# Altium footprint library PCBLIB.PcbLib: 103 footprints (part 1 of 7)
Each footprint in its own frame and in the unit in brackets; x right, y up, seen from the top. Pads: shape width x height; smd on the part's side, far side on the other; paste and mask are expansions set on the pad; w line width, h text height; cw(c..) or ccw(c..) is an arc to the next point about the centre after c.
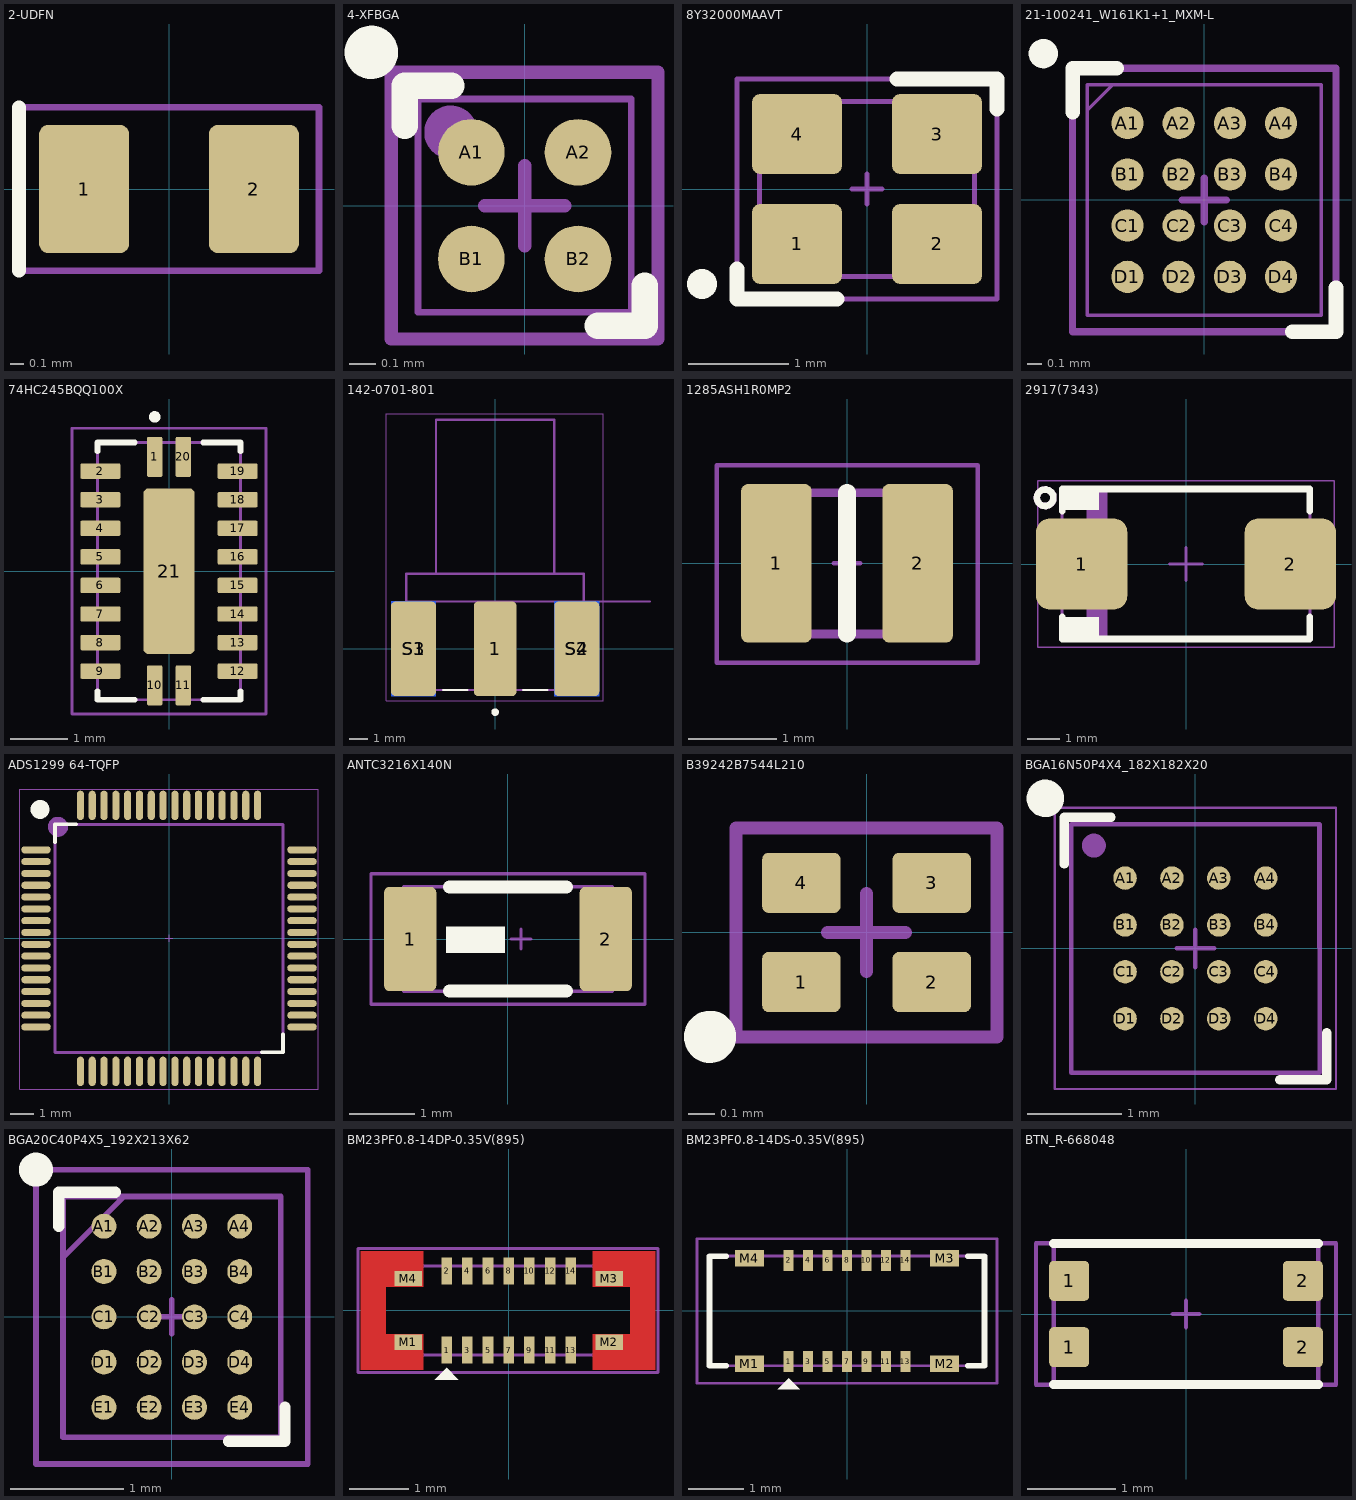
[diagram p0: the footprints below, top view; thin cyan lines are the x and y axes]

## 2-UDFN [mil]
pads (2):
  rrect20% 26x37 smd paste+0 mask+1.97: 1(-24.5,0) 2(24.5,0)
Top Overlay:
  lines w3.94: -43.31,-23.62 -43.31,23.62
Top Component Outline:
  lines w1.97: -43.31,-23.62 43.31,-23.62 43.31,23.62 -43.31,23.62 -43.31,-23.62
3D body "CR_UCLAMP0571PTNT_SEM.step": height 22.24, standoff 0, extent -32.52,-20.51 32.52,20.51

## 4-XFBGA [mm] "Power Switch/Driver 1:1 P-Channel 500mA 4-DSBGA (0.8x0.8)"
pads (4):
  round 0.25 smd mask+0.05: A1(-0.2,0.2) A2(0.2,0.2) B1(-0.2,-0.2) B2(0.2,-0.2)
Top Overlay:
  circle w0.1: c-0.575,0.575 r0.05
  lines w0.1: -0.45,0.3 -0.45,0.45 -0.275,0.45 ; 0.275,-0.45 0.45,-0.45 0.45,-0.3
Top Component Center:
  lines w0.05: -0.15,0 0.15,0 ; 0,-0.15 0,0.15
Top Component Outline:
  circle w0.1: c-0.277,0.275 r0.05
  lines w0.05: -0.5,-0.5 -0.5,0.5 0.5,0.5 0.5,-0.5 -0.5,-0.5
Top Assembly:
  lines w0.025: -0.4,-0.4 0.4,-0.4 0.4,0.4 -0.4,0.4 -0.4,-0.4
  text ".Designator" at -0.674,-0.068 h0.3
3D body "YFP4_TEX.step": height 0.5, standoff 0, extent -0.4,-0.4 0.4,0.4

## 8Y32000MAAVT [mm]
pads (4):
  rrect20% 0.9x0.8 smd mask+0.05: 1(-0.7,-0.55) 2(0.7,-0.55) 3(0.7,0.55) 4(-0.7,0.55)
Top Overlay:
  lines w0.15: -1.3,-0.8 -1.3,-1.1 -0.3,-1.1 ; 0.3,1.1 1.3,1.1 1.3,0.8
  lines w0.2: -1.7,-0.95 cw(c-1.65,-0.95) -1.6,-0.95 ; -1.7,-0.95 ccw(c-1.65,-0.95) -1.6,-0.95 ; -1.7,-0.95 -1.6,-0.95
Top Component Center:
  lines w0.05: -0.15,0 0.15,0 ; 0,-0.15 0,0.15
Top Component Outline:
  lines w0.05: -1.3,-1.1 1.3,-1.1 1.3,1.1 -1.3,1.1 -1.3,-1.1
Top Assembly:
  lines w0.05: -1.075,-0.875 -1.075,0.875 1.075,0.875 1.075,-0.875 -1.075,-0.875
  text ".Designator" at -0.897,-0.09 h0.4
3D body "User Library-TG-5006CJ.STEP": height 0.73, standoff 0, extent -1,-0.8 1,0.8

## 21-100241_W161K1+1_MXM-L [mm]
pads (16):
  round 0.22 smd paste+0 mask+0.05: A1(-0.525,0.525) A2(-0.175,0.525) A3(0.175,0.525) A4(0.525,0.525) B1(-0.525,0.175) B2(-0.175,0.175) B3(0.175,0.175) B4(0.525,0.175) C1(-0.525,-0.175) C2(-0.175,-0.175) C3(0.175,-0.175) C4(0.525,-0.175) D1(-0.525,-0.525) D2(-0.175,-0.525) D3(0.175,-0.525) D4(0.525,-0.525)
Top Overlay:
  circle w0.1: c-1.1,1 r0.05
  lines w0.1: -0.9,0.6 -0.9,0.9 -0.6,0.9 ; 0.6,-0.9 0.9,-0.9 0.9,-0.6
Top Component Center:
  lines w0.05: -0.15,0 0.15,0 ; 0,-0.15 0,0.15
Top Component Outline:
  lines w0.05: -0.9,-0.9 -0.9,0.9 0.9,0.9 0.9,-0.9 -0.9,-0.9
Top Assembly:
  lines w0.025: -0.8,0.612 -0.625,0.787 ; -0.8,-0.787 -0.8,0.787 0.8,0.787 0.8,-0.787 -0.8,-0.787
  text ".Designator" at -0.897,-0.09 h0.4
3D body "21-100241_W161K1+1_MXM.step": height 0.69, standoff 0, extent -0.8,-0.787 0.8,0.787

## 74HC245BQQ100X [mm]
pads (21):
  rrect20% 0.27x0.7 smd mask+0.05: 1(-0.25,2) 10(-0.25,-2) 11(0.25,-2) 20(0.25,2)
  rrect20% 0.7x0.27 smd mask+0.05: 2(-1.2,1.75) 3(-1.2,1.25) 4(-1.2,0.75) 5(-1.2,0.25) 6(-1.2,-0.25) 7(-1.2,-0.75) 8(-1.2,-1.25) 9(-1.2,-1.75) 12(1.2,-1.75) 13(1.2,-1.25) 14(1.2,-0.75) 15(1.2,-0.25) 16(1.2,0.25) 17(1.2,0.75) 18(1.2,1.25) 19(1.2,1.75)
  rrect20% 0.9x2.9 smd mask+0.05: 21(0,0)
Top Overlay:
  lines w0.1: -1.25,-2.1 -1.25,-2.25 -0.6,-2.25 ; -1.25,2.1 -1.25,2.25 -0.6,2.25 ; -0.297,2.683 ccw(c-0.25,2.7) -0.3,2.7 ccw(c-0.25,2.7) -0.2,2.7 ; 0.6,-2.25 1.25,-2.25 1.25,-2.1 ; 0.6,2.25 1.25,2.25 1.25,2.1
Top Component Center:
  lines w0.05: -0.15,0 0.15,0 ; 0,-0.15 0,0.15
Top Component Outline:
  lines w0.05: -1.7,-2.5 -1.7,2.5 1.7,2.5 1.7,-2.5 -1.7,-2.5
Top Assembly:
  lines w0.05: -1.25,-2.25 1.25,-2.25 1.25,2.25 -1.25,2.25 -1.25,-2.25
  text ".Designator" at -0.897,-0.09 h0.4
3D body "NVT2008BQ,115.stp": height 1.1, standoff 0, extent -1.25,-2.25 1.25,2.25

## 142-0701-801 [mil] "CONN SMA JACK STR 50OHM EDGE MNT"
height 327.95
pads (5):
  rrect20% 90x200 smd: 1(0,0)
  rrect20% 95x200 smd: S1(-172.5,0) S2(172.5,0)
  rect 95x200 smd far side: S3(-172.5,0) S4(172.5,0)
Top Overlay:
  circle w7.87: c0,-133.86 r3.94
  lines w5: -110.24,-87 -59.06,-87 ; 59.06,-87 110.24,-87
Top Component Outline:
  lines w1.97: -229.84,-110.24 -229.84,496.06 228.35,496.06 228.35,-110.24 -229.84,-110.24
Bottom Courtyard:
  lines w5: 188.98,100 326.77,100 ; -187.5,100 187.5,100 ; -187.5,100 -187.5,-87 187.5,-87 187.5,100 ; -187.5,100 -187.5,158.5 -125,158.5 ; -125,158.5 125,158.5 ; -125,158.5 -125,484.25 125,484.25 125,158.5 ; 125,158.5 187.5,158.5 187.5,100
  text "PCB Edge" at 248.03,114.17 h50
3D body "142-0701-801.stp": height 171.75, standoff -140.25, extent -187.5,-68.89 187.5,493.11

## 1285ASH1R0MP2 [mm]
pads (2):
  rrect20% 0.8x1.8 smd mask+0.05: 1(-0.8,0) 2(0.8,0)
Top Overlay:
  lines w0.2: 0,-0.8 0,0.8
Top Component Center:
  lines w0.05: -0.15,0 0.15,0 ; 0,-0.15 0,0.15
Top Component Outline:
  lines w0.05: -1.475,-1.125 1.484,-1.125 1.484,1.11 -1.475,1.11 -1.475,-1.125
Top Assembly:
  lines w0.1: -1,-0.8 -1,0.8 1,0.8 1,-0.8 -1,-0.8
  text ".Designator" at -0.897,-0.09 h0.4
3D body "DFE201610P-R47M=P2.STEP": height 1, standoff 0, extent -1,-0.8 1,0.8

## 2917(7343) [mm] "Chip Capacitor, 2-Leads, Body 7,30x4,30mm, IPC Medium Density"
height 1.9
pads (2):
  rrect30% 2.8x2.8 smd mask+0.05: 1(-3.2,0) 2(3.2,0)
Top Overlay:
  circle w0.2: c-4.318,2.032 r0.254
  rectangle: -3.8,1.651 -2.667,2.3
  rectangle: -3.8,-2.286 -2.667,-1.625
  lines w0.2: -3.8,-1.625 -3.8,-2.3 3.8,-2.3 3.8,-1.625 ; -3.8,1.625 -3.8,2.3 3.8,2.3 3.8,1.625
Top Designator:
  text ".Designator" at -1.589,-0.158 h0.7
Bottom Courtyard:
  circle w0.2: c-4.318,2.032 r0.254
  rectangle: -3.048,-2.286 -2.413,2.286
  lines w0.1: -3.8,-2.3 -3.8,2.3 3.8,2.3 3.8,-2.3 -3.8,-2.3
Bottom 3D Body:
  lines w0.05: -4.55,-2.55 -4.55,2.55 4.55,2.55 4.55,-2.55 -4.55,-2.55
  lines w0.1: -0.5,0 0.5,0 ; 0,-0.5 0,0.5
3D body "User Library-CAP_TANT_7343-31.step": height 3.1, standoff 0, extent -3.8,-2.3 3.8,2.3

## ADS1299 64-TQFP [mm] "12x12 mm, 0.5mm pitch"
height 1
pads (64):
  oval 1.25x0.3 smd mask+0.05: 1(-5.63,3.75) 2(-5.63,3.25) 3(-5.63,2.75) 4(-5.63,2.25) 5(-5.63,1.75) 6(-5.63,1.25) 7(-5.63,0.75) 8(-5.63,0.25) 9(-5.63,-0.25) 10(-5.63,-0.75) 11(-5.63,-1.25) 12(-5.63,-1.75) 13(-5.63,-2.25) 14(-5.63,-2.75) 15(-5.63,-3.25) 16(-5.63,-3.75) 33(5.63,-3.75) 34(5.63,-3.25) 35(5.63,-2.75) 36(5.63,-2.25) 37(5.63,-1.75) 38(5.63,-1.25) 39(5.63,-0.75) 40(5.63,-0.25) 41(5.63,0.25) 42(5.63,0.75) 43(5.63,1.25) 44(5.63,1.75) 45(5.63,2.25) 46(5.63,2.75) 47(5.63,3.25) 48(5.63,3.75)
  oval 0.3x1.25 smd mask+0.05: 17(-3.75,-5.63) 18(-3.25,-5.63) 19(-2.75,-5.63) 20(-2.25,-5.63) 21(-1.75,-5.63) 22(-1.25,-5.63) 23(-0.75,-5.63) 24(-0.25,-5.63) 25(0.25,-5.63) 26(0.75,-5.63) 27(1.25,-5.63) 28(1.75,-5.63) 29(2.25,-5.63) 30(2.75,-5.63) 31(3.25,-5.63) 32(3.75,-5.63) 49(3.75,5.63) 50(3.25,5.63) 51(2.75,5.63) 52(2.25,5.63) 53(1.75,5.63) 54(1.25,5.63) 55(0.75,5.63) 56(0.25,5.63) 57(-0.25,5.63) 58(-0.75,5.63) 59(-1.25,5.63) 60(-1.75,5.63) 61(-2.25,5.63) 62(-2.75,5.63) 63(-3.25,5.63) 64(-3.75,5.63)
Top Overlay:
  circle w0.4: c-5.461,5.461 r0.2
  lines w0.15: -4.826,4.064 -4.826,4.826 -3.937,4.826 ; 3.937,-4.826 4.826,-4.826 4.826,-4.064
Mechanical 1:
  lines w0.127: -4.826,-4.826 4.826,-4.826 4.826,4.826 -4.826,4.826 -4.826,-4.826
Top Component Outline:
  circle w0.5: c-4.7,4.725 r0.174
  lines w0.05: -6.325,-6.375 -6.325,6.325 6.325,6.325 6.325,-6.375 -6.325,-6.375
Top Designator:
  text ".Designator" at 0.897,0.065 h0.4
Bottom Designator:
  text ".Designator" at -2.385,-0.369 h1.52
Mechanical 10:
  lines w0.05: -0.15,0 0.15,0 ; 0,-0.15 0,0.15
  lines w0.1: -4.826,-4.826 -4.826,4.826 4.826,4.826 4.826,-4.826 -4.826,-4.826
  text ".Designator" at 1.126,0.088 h0.5
3D body "User Library-S-PQFP-G64.step": height 1, standoff 0, extent -5.791,-5.787 5.79,5.787

## ANTC3216X140N [mm]
pads (2):
  rrect20% 0.8x1.6 smd mask+0.05: 1(-1.5,0) 2(1.5,0)
Top Overlay:
  region: -0.95,0.187 -0.95,-0.213 -0.05,-0.213 -0.05,0.187
  lines w0.2: -0.9,-0.8 0.9,-0.8 ; -0.9,0.8 0.9,0.8
Top Component Outline:
  lines w0.05: -2.1,-1 2.1,-1 2.1,1 -2.1,1 -2.1,-1
Top Designator:
  text ".Designator" at -0.697,-0.09 h0.4
Mechanical 10:
  lines w0.05: 0.05,0 0.35,0 ; 0.2,-0.15 0.2,0.15 ; -1.6,-0.8 -1.6,0.8 1.6,0.8 1.6,-0.8 -1.6,-0.8
3D body "2450AT18A100E--3DModel-STEP-56544.STEP": height 1.4, standoff 0, extent -1.6,-0.8 1.6,0.8

## B39242B7544L210 [mm]
pads (4):
  rrect20% 0.3x0.23 smd mask+0.05: 1(-0.25,-0.19) 2(0.25,-0.19) 3(0.25,0.19) 4(-0.25,0.19)
Top Overlay:
  circle w0.1: c-0.6,-0.4 r0.05
Top Component Center:
  lines w0.05: -0.15,0 0.15,0 ; 0,-0.15 0,0.15
Top Component Outline:
  lines w0.05: -0.5,-0.4 0.5,-0.4 0.5,0.4 -0.5,0.4 -0.5,-0.4
Top Assembly:
  text ".Designator" at -0.897,-0.09 h0.4
3D body: height 0.35, standoff 0, extent -0.4,-0.3 0.4,0.3

## BGA16N50P4X4_182X182X20 [mm] "Amplifier IC 2-Channel (Stereo) Class D 16-DSBGA (2.24x2.16)"
pads (16):
  round 0.25 smd paste+0 mask+0.05: A1(-0.75,0.75) A2(-0.25,0.75) A3(0.25,0.75) A4(0.75,0.75) B1(-0.75,0.25) B2(-0.25,0.25) B3(0.25,0.25) B4(0.75,0.25) C1(-0.75,-0.25) C2(-0.25,-0.25) C3(0.25,-0.25) C4(0.75,-0.25) D1(-0.75,-0.75) D2(-0.25,-0.75) D3(0.25,-0.75) D4(0.75,-0.75)
Top Overlay:
  circle w0.2: c-1.6,1.6 r0.1
  lines w0.1: -1.4,0.9 -1.4,1.4 -0.9,1.4 ; 0.9,-1.4 1.4,-1.4 1.4,-0.9
Top Component Outline:
  circle w0.2: c-1.083,1.096 r0.027
  lines w0.025: -1.5,-1.5 1.5,-1.5 1.5,1.5 -1.5,1.5 -1.5,-1.5
Top Designator:
  text ".Designator" at 0.021,-0.858 h0.4
Bottom Designator:
  text ".designator" at -1.1,-0.025 h0.5
Mechanical 10:
  lines w0.05: -0.2,0 0.2,0 ; 0,-0.2 0,0.2 ; -1.325,-1.325 -1.325,1.325 1.325,1.325 1.325,-1.325 -1.325,-1.325
  text ".Designator" at 0.838,0.135 h0.5
3D body "YZH16.step": height 0.63, standoff 0, extent -1.325,-1.325 1.325,1.325
3D body: height 0.25, standoff 0, extent 0,0 0.254,0.254

## BGA20C40P4X5_192X213X62 [mm]
pads (20):
  round 0.22 smd mask+0.05: A1(-0.6,0.8) A2(-0.2,0.8) A3(0.2,0.8) A4(0.6,0.8) B1(-0.6,0.4) B2(-0.2,0.4) B3(0.2,0.4) B4(0.6,0.4) C1(-0.6,0) C2(-0.2,0) C3(0.2,0) C4(0.6,0) D1(-0.6,-0.4) D2(-0.2,-0.4) D3(0.2,-0.4) D4(0.6,-0.4) E1(-0.6,-0.8) E2(-0.2,-0.8) E3(0.2,-0.8) E4(0.6,-0.8)
Top Overlay:
  circle w0.2: c-1.2,1.3 r0.05
  lines w0.1: -1,0.8 -1,1.1 -0.5,1.1 ; 0.5,-1.1 1,-1.1 1,-0.8
Top Component Center:
  lines w0.05: -0.15,0 0.15,0 ; 0,-0.15 0,0.15
Top Component Outline:
  lines w0.05: -1.2,-1.3 1.2,-1.3 1.2,1.3 -1.2,1.3 -1.2,-1.3
Top Assembly:
  lines w0.05: -0.961,0.524 -0.422,1.063 ; -0.961,-1.063 0.961,-1.063 0.961,1.063 -0.961,1.063 -0.961,-1.063
  text ".Designator" at -1.126,-0.113 h0.5
3D body "TPS63012YFFR.stp": height 0.63, standoff 0, extent -0.961,-1.063 0.961,1.063

## BM23PF0.8-14DP-0.35V(895) [mm]
pads (18):
  rect 0.18x0.46 smd mask+0.05: 1(-1.05,-0.67) 2(-1.05,0.67) 3(-0.7,-0.67) 4(-0.7,0.67) 5(-0.35,-0.67) 6(-0.35,0.67) 7(0,-0.67) 8(0,0.67) 9(0.35,-0.67) 10(0.35,0.67) 11(0.7,-0.67) 12(0.7,0.67) 13(1.05,-0.67) 14(1.05,0.67)
  rect 0.47x0.26 smd mask+0.05: M1(-1.7,-0.54) M2(1.7,-0.54) M3(1.7,0.54) M4(-1.7,0.54)
Top Layer:
  region: 2.475,-1 2.475,1 1.425,1 1.425,0.4 2.055,0.4 2.055,-0.4 1.425,-0.4 1.425,-1
  region: -2.5,-1 -2.5,1 -1.45,1 -1.45,0.4 -2.08,0.4 -2.08,-0.4 -1.45,-0.4 -1.45,-1
Top Overlay:
  region: -1.25,-1.17 -1.05,-0.97 -0.85,-1.17
Top Component Outline:
  lines w0.05: -2.55,-1.05 2.525,-1.05 2.525,1.05 -2.55,1.05 -2.55,-1.05
Top Assembly:
  lines w0.05: -2.125,-0.75 2.125,-0.75 2.125,0.75 -2.125,0.75 -2.125,-0.75
3D body "BM23PF0.8-14DP-0.35V(51)_4800366051_3dstep.stp": height -0.41, standoff -1.05, extent -2.125,-0.75 2.125,0.75

## BM23PF0.8-14DS-0.35V(895) [mm]
pads (18):
  rect 0.18x0.38 smd mask+0.05: 1(-1.05,-0.91) 2(-1.05,0.91) 3(-0.7,-0.91) 4(-0.7,0.91) 5(-0.35,-0.91) 6(-0.35,0.91) 7(0,-0.91) 8(0,0.91) 9(0.35,-0.91) 10(0.35,0.91) 11(0.7,-0.91) 12(0.7,0.91) 13(1.05,-0.91) 14(1.05,0.91)
  rect 0.52x0.3 smd mask+0.05: M1(-1.755,-0.95) M2(1.755,-0.95) M3(1.755,0.95) M4(-1.755,0.95)
Top Overlay:
  region: -1.25,-1.41 -1.05,-1.21 -0.85,-1.41
  lines w0.1: -2.175,-0.988 -2.475,-0.988 -2.475,0.987 -2.175,0.987 ; 2.175,-0.988 2.475,-0.988 2.475,0.987 2.175,0.987
Top Component Outline:
  lines w0.05: -2.7,-1.3 -2.7,1.3 2.7,1.3 2.7,-1.3 -2.7,-1.3
Top Assembly:
  lines w0.05: -2.475,-0.988 -2.475,0.987 2.475,0.987 2.475,-0.988 -2.475,-0.988
3D body "BM23PF0.8-14DS-0.35V(51)_4800367051_3dstep.stp": height 0.79, standoff -0.01, extent -2.475,-0.993 2.475,0.987

## BTN_R-668048 [mm] "SWITCH TACTILE, SPST-NO, 0.02A 1"
height 0.6
pads (4):
  rrect20% 0.45x0.45 smd mask+0.05: 1(-1.325,-0.375) 1(-1.325,0.375) 2(1.325,-0.375) 2(1.325,0.375)
Top Overlay:
  lines w0.1: -1.5,-0.8 1.5,-0.8 ; -1.5,0.8 1.5,0.8
Top Component Outline:
  lines w0.05: -1.7,-0.8 1.7,-0.8 1.7,0.8 -1.7,0.8 -1.7,-0.8
Top Designator:
  text ".Designator" at 0.897,0.09 h0.4
Bottom Designator:
  text ".Designator" at -1.217,-0.113 h0.5
Mechanical 10:
  lines w0.05: -0.15,0 0.15,0 ; 0,-0.15 0,0.15 ; -1.5,-0.8 1.5,-0.8 1.5,0.8 -1.5,0.8 -1.5,-0.8
3D body "User Library-EVPBB2A9B000.step": height 0.51, standoff -0.03, extent -1.5,-0.9 1.5,0.9